# Altium schematic symbol library NXP_60_26022015.SCHLIB: 1306 symbols (part 15 of 28)
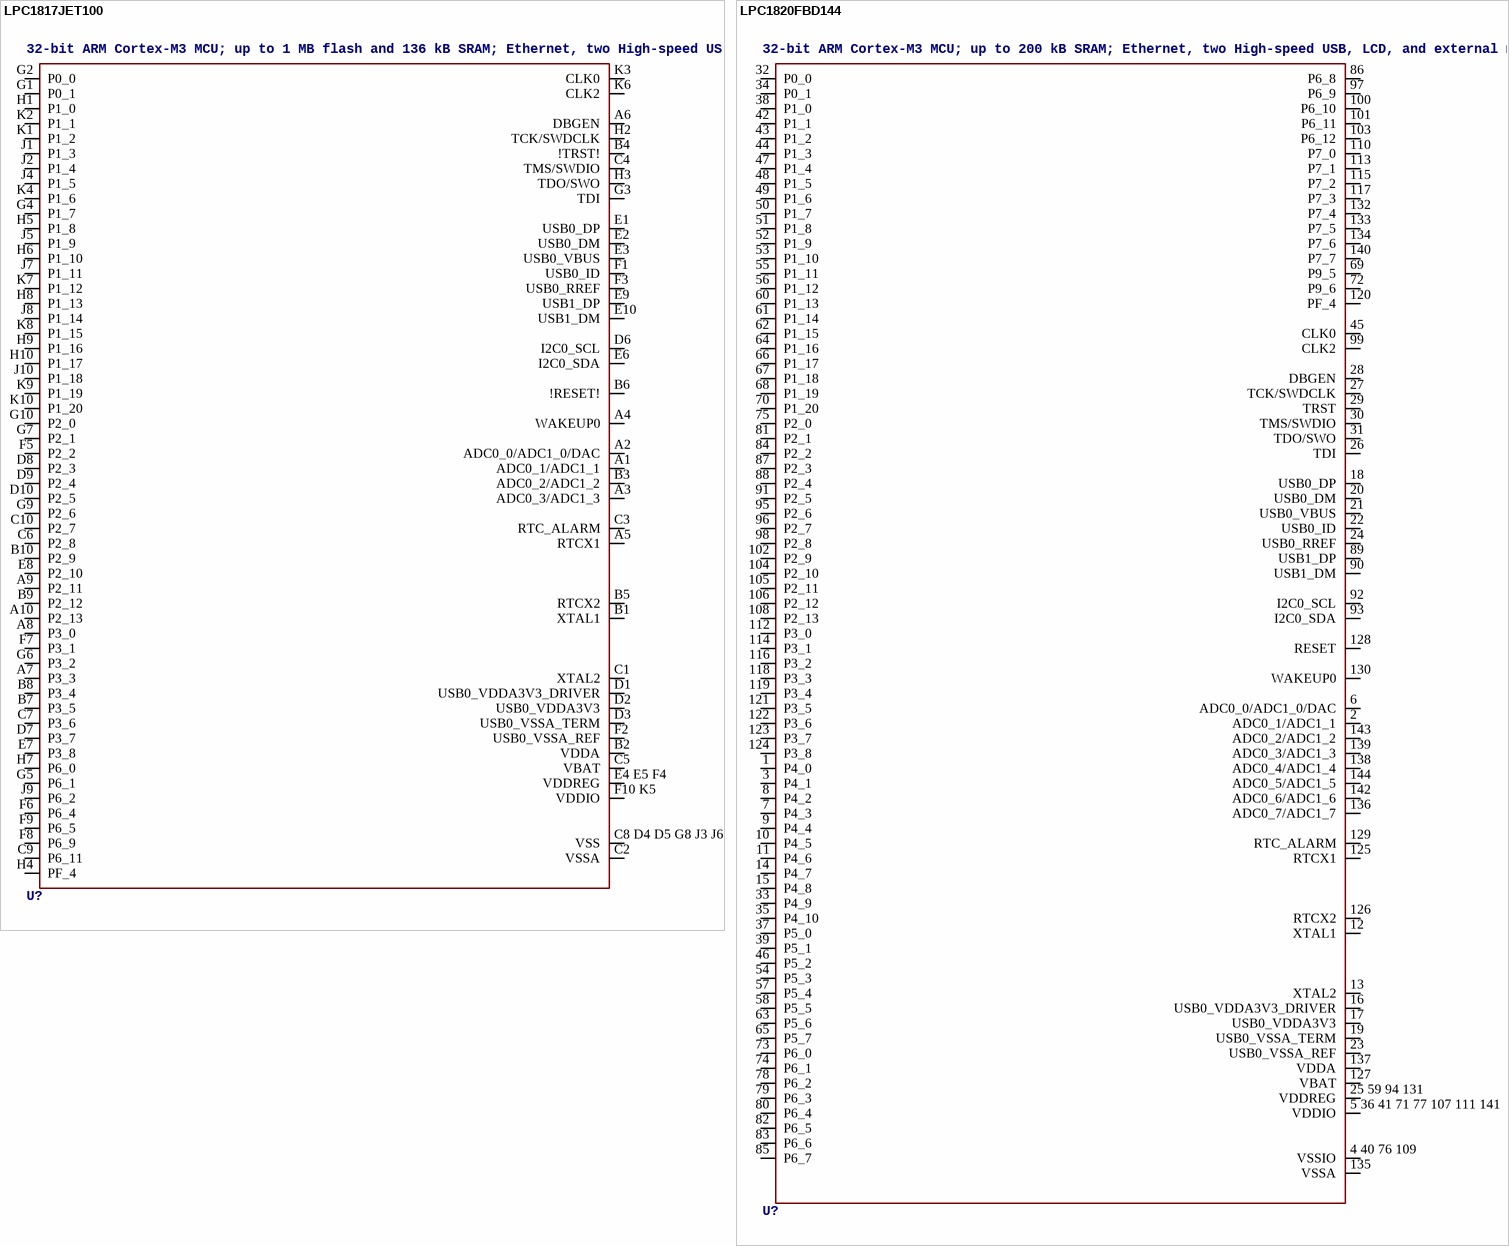
[diagram p199: symbols LPC1817JET100 to LPC1820FBD144]

## LPC1817JET100
designator U?, comment 32-bit ARM Cortex-M3 MCU; up to 1 MB flash and 136 kB SRAM; Ethernet, two High-speed USB, LCD, EMC The LPC185x/3x/2x/1x are ARM Cortex-M3 based microcontrollers for embedded applications. The ARM Cortex-M3 is a next generation core that offers system enhancements such as low power consumption, enhanced debug features, and a high level of support block integration. The LPC185x/3x/2x/1x operate at CPU frequencies of up to 180 MHz. The ARM Cortex-M3 CPU incorporates a 3-stage pipeline and uses a Harvard architecture with separate local instruction and data buses as well as a third bus for peripherals. The ARM Cortex-M3 CPU also includes an internal prefetch unit that supports speculative branching. The LPC185x/3x/2x/1x include up to 1 MB of flash and 136 kB of on-chip SRAM, 16 kB of EEPROM memory, a quad SPI Flash Interface (SPIFI), a State Configurable Timer (SCT) subsystem, two High-speed USB controllers, Ethernet, LCD, an external memory controller, and multiple digital and analog peripherals.    AAL Eindhoven MK
ADC: 4; ETHERNET: yes; FLASH: 1MB; GPIO: 49; LCD: no; SRAM: 136kB; TEMPERATURE_RANGE: -40 °C to +105 °C; PWM: no; QEI: no; USB0: No; USB1: No
footprint SOT926-1
pins: A1 ADC0_1/ADC1_1, A2 ADC0_0/ADC1_0/DAC, A3 ADC0_3/ADC1_3, A4 WAKEUP0, A5 RTCX1, A6 DBGEN, A7 P3_3, A8 P3_0, A9 P2_11, A10 P2_13, B1 XTAL1, B2 VDDA, B3 ADC0_2/ADC1_2, B4 !TRST!, B5 RTCX2, B6 !RESET!, B7 P3_5, B8 P3_4, B9 P2_12, B10 P2_9, C1 XTAL2, C2 VSSA, C3 RTC_ALARM, C4 TMS/SWDIO, C5 VBAT, C6 P2_8, C7 P3_6, C8 D4 D5 G8 J3 J6 VSS, C9 P6_11, C10 P2_7, D1 USB0_VDDA3V3_DRIVER, D2 USB0_VDDA3V3, D3 USB0_VSSA_TERM, D6 I2C0_SCL, D7 P3_7, D8 P2_3, D9 P2_4, D10 P2_5, E1 USB0_DP, E2 USB0_DM, E3 USB0_VBUS, E4 E5 F4 VDDREG, E6 I2C0_SDA, E7 P3_8, E8 P2_10, E9 USB1_DP, E10 USB1_DM, F1 USB0_ID, F2 USB0_VSSA_REF, F3 USB0_RREF, F5 P2_2, F6 P6_4, F7 P3_1, F8 P6_9, F9 P6_5, F10 K5 VDDIO, G1 P0_1, G2 P0_0, G3 TDI, G4 P1_7, G5 P6_1, G6 P3_2, G7 P2_1, G9 P2_6, G10 P2_0, H1 P1_0, H2 TCK/SWDCLK, H3 TDO/SWO, H4 PF_4, H5 P1_8, H6 P1_10, H7 P6_0, H8 P1_13, H9 P1_16, H10 P1_17, J1 P1_3, J2 P1_4, J4 P1_5, J5 P1_9, J7 P1_11, J8 P1_14, J9 P6_2, J10 P1_18, K1 P1_2, K2 P1_1, K3 CLK0, K4 P1_6, K6 CLK2, K7 P1_12, K8 P1_15, K9 P1_19, K10 P1_20

## LPC1820FBD144
designator U?, comment 32-bit ARM Cortex-M3 MCU; up to 200 kB SRAM; Ethernet, two High-speed USB, LCD, and external memory controller The LPC1850/30/20/10 are ARM Cortex-M3 based microcontrollers for embedded applications. The ARM Cortex-M3 is a next generation core that offers system enhancements such as low power consumption, enhanced debug features, and a high level of support block integration. The LPC1850/30/20/10 operate at CPU frequencies of up to 180 MHz. The ARM Cortex-M3 CPU incorporates a 3-stage pipeline and uses a Harvard architecture with separate local instruction and data buses as well as a third bus for peripherals. The ARM Cortex-M3 CPU also includes an internal prefetch unit that supports speculative branching. The LPC1850/30/20/10 include up to 200 kB of on-chip SRAM, a quad SPI Flash Interface (SPIFI), a State Configurable Timer (SCT) subsystem, two High-speed USB controllers, Ethernet, LCD, an external memory controller, and multiple digital and analog peripherals.    AAL Eindhoven MK
ADC: 8; ETHERNET: no; GPIO: 83; PWM: yes; SRAM: 168kB; USB0: Host/OTG; LCD: no; QEI: no; USB1: No
footprint SOT486-1
pins: 1 P4_0, 2 ADC0_1/ADC1_1, 3 P4_1, 4 40 76 109 VSSIO, 5 36 41 71 77 107 111 141 VDDIO, 6 ADC0_0/ADC1_0/DAC, 7 P4_3, 8 P4_2, 9 P4_4, 10 P4_5, 11 P4_6, 12 XTAL1, 13 XTAL2, 14 P4_7, 15 P4_8, 16 USB0_VDDA3V3_DRIVER, 17 USB0_VDDA3V3, 18 USB0_DP, 19 USB0_VSSA_TERM, 20 USB0_DM, 21 USB0_VBUS, 22 USB0_ID, 23 USB0_VSSA_REF, 24 USB0_RREF, 25 59 94 131 VDDREG, 26 TDI, 27 TCK/SWDCLK, 28 DBGEN, 29 TRST, 30 TMS/SWDIO, 31 TDO/SWO, 32 P0_0, 33 P4_9, 34 P0_1, 35 P4_10, 37 P5_0, 38 P1_0, 39 P5_1, 42 P1_1, 43 P1_2, 44 P1_3, 45 CLK0, 46 P5_2, 47 P1_4, 48 P1_5, 49 P1_6, 50 P1_7, 51 P1_8, 52 P1_9, 53 P1_10, 54 P5_3, 55 P1_11, 56 P1_12, 57 P5_4, 58 P5_5, 60 P1_13, 61 P1_14, 62 P1_15, 63 P5_6, 64 P1_16, 65 P5_7, 66 P1_17, 67 P1_18, 68 P1_19, 69 P9_5, 70 P1_20, 72 P9_6, 73 P6_0, 74 P6_1, 75 P2_0, 78 P6_2, 79 P6_3, 80 P6_4, 81 P2_1, 82 P6_5, 83 P6_6, 84 P2_2, 85 P6_7, 86 P6_8, 87 P2_3, 88 P2_4, 89 USB1_DP, 90 USB1_DM, 91 P2_5, 92 I2C0_SCL, 93 I2C0_SDA, 95 P2_6, 96 P2_7, 97 P6_9, 98 P2_8, 99 CLK2, 100 P6_10, 101 P6_11, 102 P2_9, 103 P6_12, 104 P2_10, 105 P2_11, 106 P2_12, 108 P2_13, 110 P7_0, 112 P3_0, 113 P7_1, 114 P3_1, 115 P7_2, 116 P3_2, 117 P7_3, 118 P3_3, 119 P3_4, 120 PF_4, 121 P3_5, 122 P3_6, 123 P3_7, 124 P3_8, 125 RTCX1, 126 RTCX2, 127 VBAT, 128 RESET, 129 RTC_ALARM, 130 WAKEUP0, 132 P7_4, 133 P7_5, 134 P7_6, 135 VSSA, 136 ADC0_7/ADC1_7, 137 VDDA, 138 ADC0_4/ADC1_4, 139 ADC0_3/ADC1_3, 140 P7_7, 142 ADC0_6/ADC1_6, 143 ADC0_2/ADC1_2, 144 ADC0_5/ADC1_5

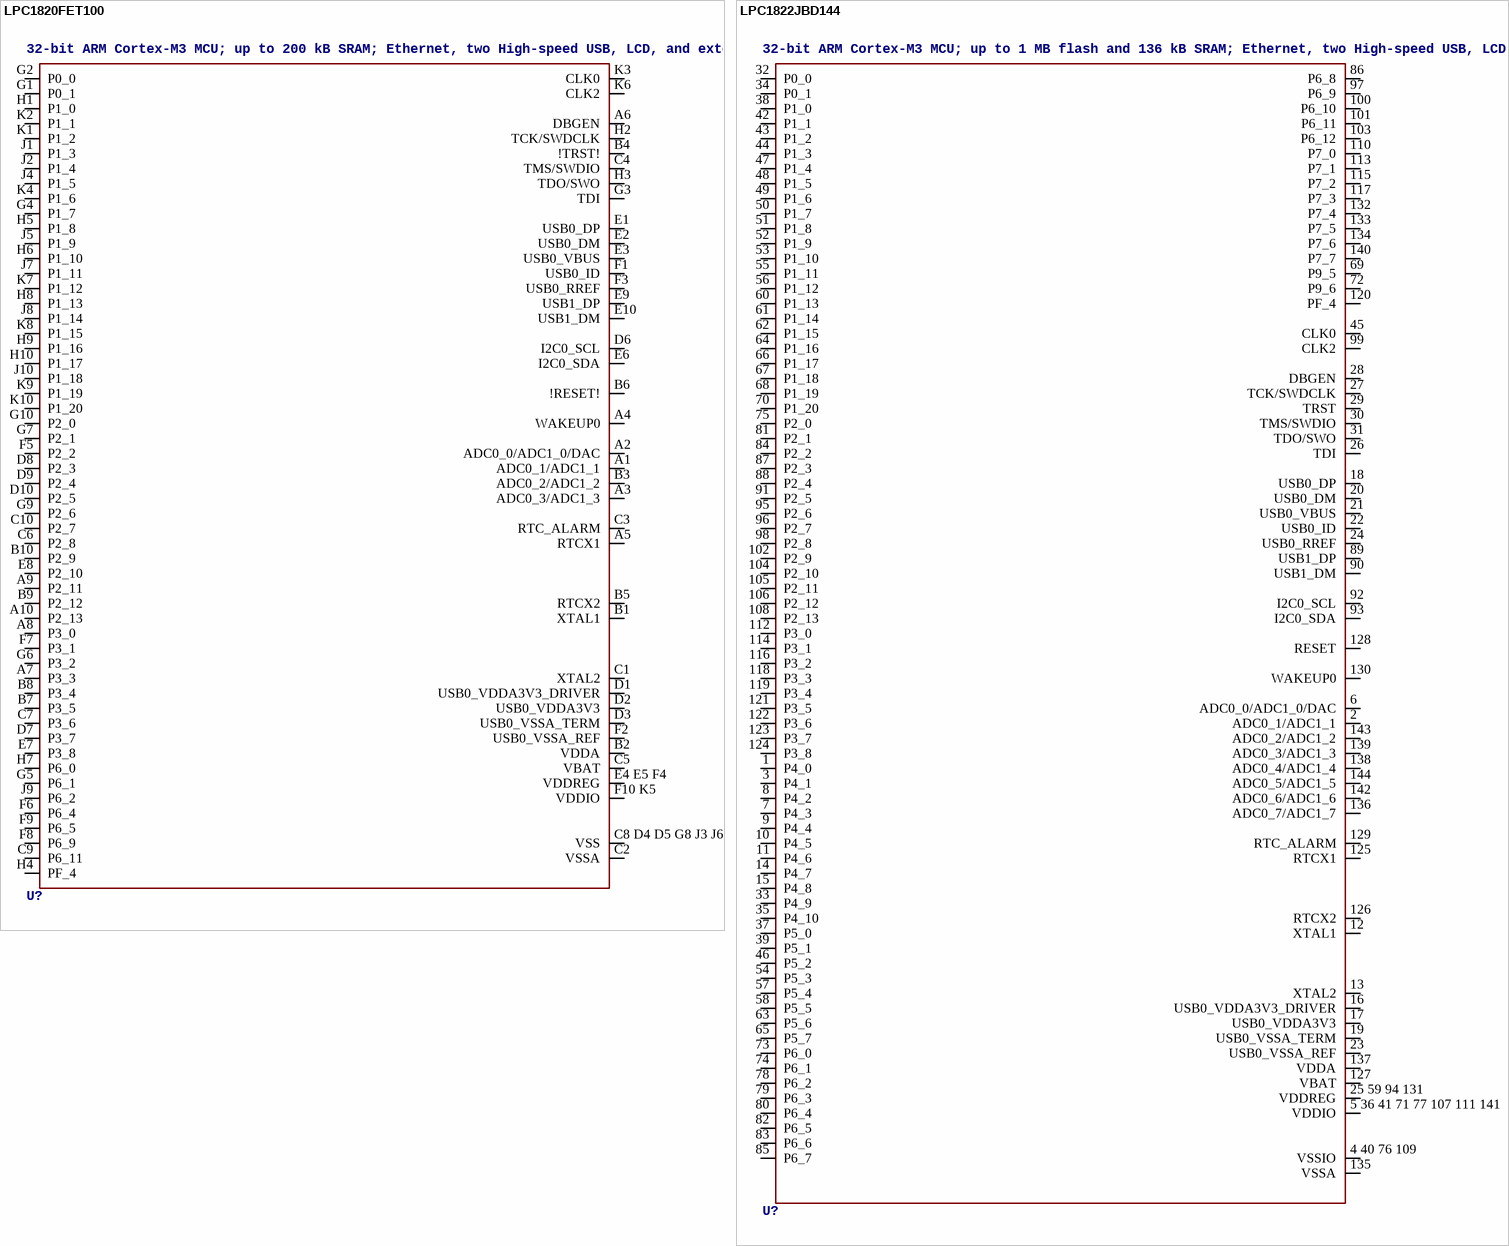
[diagram p91: symbols LPC1820FET100 to LPC1822JBD144]

## LPC1820FET100
designator U?, comment 32-bit ARM Cortex-M3 MCU; up to 200 kB SRAM; Ethernet, two High-speed USB, LCD, and external memory controller The LPC1850/30/20/10 are ARM Cortex-M3 based microcontrollers for embedded applications. The ARM Cortex-M3 is a next generation core that offers system enhancements such as low power consumption, enhanced debug features, and a high level of support block integration. The LPC1850/30/20/10 operate at CPU frequencies of up to 180 MHz. The ARM Cortex-M3 CPU incorporates a 3-stage pipeline and uses a Harvard architecture with separate local instruction and data buses as well as a third bus for peripherals. The ARM Cortex-M3 CPU also includes an internal prefetch unit that supports speculative branching. The LPC1850/30/20/10 include up to 200 kB of on-chip SRAM, a quad SPI Flash Interface (SPIFI), a State Configurable Timer (SCT) subsystem, two High-speed USB controllers, Ethernet, LCD, an external memory controller, and multiple digital and analog peripherals.    AAL Eindhoven MK
ADC: 4; ETHERNET: no; GPIO: 49; SRAM: 168kB; USB0: Host/OTG; LCD: no; PWM: no; QEI: no; USB1: No
footprint SOT926-1
pins: A1 ADC0_1/ADC1_1, A2 ADC0_0/ADC1_0/DAC, A3 ADC0_3/ADC1_3, A4 WAKEUP0, A5 RTCX1, A6 DBGEN, A7 P3_3, A8 P3_0, A9 P2_11, A10 P2_13, B1 XTAL1, B2 VDDA, B3 ADC0_2/ADC1_2, B4 !TRST!, B5 RTCX2, B6 !RESET!, B7 P3_5, B8 P3_4, B9 P2_12, B10 P2_9, C1 XTAL2, C2 VSSA, C3 RTC_ALARM, C4 TMS/SWDIO, C5 VBAT, C6 P2_8, C7 P3_6, C8 D4 D5 G8 J3 J6 VSS, C9 P6_11, C10 P2_7, D1 USB0_VDDA3V3_DRIVER, D2 USB0_VDDA3V3, D3 USB0_VSSA_TERM, D6 I2C0_SCL, D7 P3_7, D8 P2_3, D9 P2_4, D10 P2_5, E1 USB0_DP, E2 USB0_DM, E3 USB0_VBUS, E4 E5 F4 VDDREG, E6 I2C0_SDA, E7 P3_8, E8 P2_10, E9 USB1_DP, E10 USB1_DM, F1 USB0_ID, F2 USB0_VSSA_REF, F3 USB0_RREF, F5 P2_2, F6 P6_4, F7 P3_1, F8 P6_9, F9 P6_5, F10 K5 VDDIO, G1 P0_1, G2 P0_0, G3 TDI, G4 P1_7, G5 P6_1, G6 P3_2, G7 P2_1, G9 P2_6, G10 P2_0, H1 P1_0, H2 TCK/SWDCLK, H3 TDO/SWO, H4 PF_4, H5 P1_8, H6 P1_10, H7 P6_0, H8 P1_13, H9 P1_16, H10 P1_17, J1 P1_3, J2 P1_4, J4 P1_5, J5 P1_9, J7 P1_11, J8 P1_14, J9 P6_2, J10 P1_18, K1 P1_2, K2 P1_1, K3 CLK0, K4 P1_6, K6 CLK2, K7 P1_12, K8 P1_15, K9 P1_19, K10 P1_20

## LPC1822JBD144
designator U?, comment 32-bit ARM Cortex-M3 MCU; up to 1 MB flash and 136 kB SRAM; Ethernet, two High-speed USB, LCD, EMC The LPC185x/3x/2x/1x are ARM Cortex-M3 based microcontrollers for embedded applications. The ARM Cortex-M3 is a next generation core that offers system enhancements such as low power consumption, enhanced debug features, and a high level of support block integration. The LPC185x/3x/2x/1x operate at CPU frequencies of up to 180 MHz. The ARM Cortex-M3 CPU incorporates a 3-stage pipeline and uses a Harvard architecture with separate local instruction and data buses as well as a third bus for peripherals. The ARM Cortex-M3 CPU also includes an internal prefetch unit that supports speculative branching. The LPC185x/3x/2x/1x include up to 1 MB of flash and 136 kB of on-chip SRAM, 16 kB of EEPROM memory, a quad SPI Flash Interface (SPIFI), a State Configurable Timer (SCT) subsystem, two High-speed USB controllers, Ethernet, LCD, an external memory controller, and multiple digital and analog peripherals.    AAL Eindhoven MK
ADC: 8; ETHERNET: no; FLASH: 512kB (1 bank); GPIO: 83; PWM: yes; SRAM: 104kB; TEMPERATURE_RANGE: -40 °C to +105 °C; USB0: Host/OTG; LCD: no; QEI: no; USB1: No
footprint SOT486-1
pins: 1 P4_0, 2 ADC0_1/ADC1_1, 3 P4_1, 4 40 76 109 VSSIO, 5 36 41 71 77 107 111 141 VDDIO, 6 ADC0_0/ADC1_0/DAC, 7 P4_3, 8 P4_2, 9 P4_4, 10 P4_5, 11 P4_6, 12 XTAL1, 13 XTAL2, 14 P4_7, 15 P4_8, 16 USB0_VDDA3V3_DRIVER, 17 USB0_VDDA3V3, 18 USB0_DP, 19 USB0_VSSA_TERM, 20 USB0_DM, 21 USB0_VBUS, 22 USB0_ID, 23 USB0_VSSA_REF, 24 USB0_RREF, 25 59 94 131 VDDREG, 26 TDI, 27 TCK/SWDCLK, 28 DBGEN, 29 TRST, 30 TMS/SWDIO, 31 TDO/SWO, 32 P0_0, 33 P4_9, 34 P0_1, 35 P4_10, 37 P5_0, 38 P1_0, 39 P5_1, 42 P1_1, 43 P1_2, 44 P1_3, 45 CLK0, 46 P5_2, 47 P1_4, 48 P1_5, 49 P1_6, 50 P1_7, 51 P1_8, 52 P1_9, 53 P1_10, 54 P5_3, 55 P1_11, 56 P1_12, 57 P5_4, 58 P5_5, 60 P1_13, 61 P1_14, 62 P1_15, 63 P5_6, 64 P1_16, 65 P5_7, 66 P1_17, 67 P1_18, 68 P1_19, 69 P9_5, 70 P1_20, 72 P9_6, 73 P6_0, 74 P6_1, 75 P2_0, 78 P6_2, 79 P6_3, 80 P6_4, 81 P2_1, 82 P6_5, 83 P6_6, 84 P2_2, 85 P6_7, 86 P6_8, 87 P2_3, 88 P2_4, 89 USB1_DP, 90 USB1_DM, 91 P2_5, 92 I2C0_SCL, 93 I2C0_SDA, 95 P2_6, 96 P2_7, 97 P6_9, 98 P2_8, 99 CLK2, 100 P6_10, 101 P6_11, 102 P2_9, 103 P6_12, 104 P2_10, 105 P2_11, 106 P2_12, 108 P2_13, 110 P7_0, 112 P3_0, 113 P7_1, 114 P3_1, 115 P7_2, 116 P3_2, 117 P7_3, 118 P3_3, 119 P3_4, 120 PF_4, 121 P3_5, 122 P3_6, 123 P3_7, 124 P3_8, 125 RTCX1, 126 RTCX2, 127 VBAT, 128 RESET, 129 RTC_ALARM, 130 WAKEUP0, 132 P7_4, 133 P7_5, 134 P7_6, 135 VSSA, 136 ADC0_7/ADC1_7, 137 VDDA, 138 ADC0_4/ADC1_4, 139 ADC0_3/ADC1_3, 140 P7_7, 142 ADC0_6/ADC1_6, 143 ADC0_2/ADC1_2, 144 ADC0_5/ADC1_5

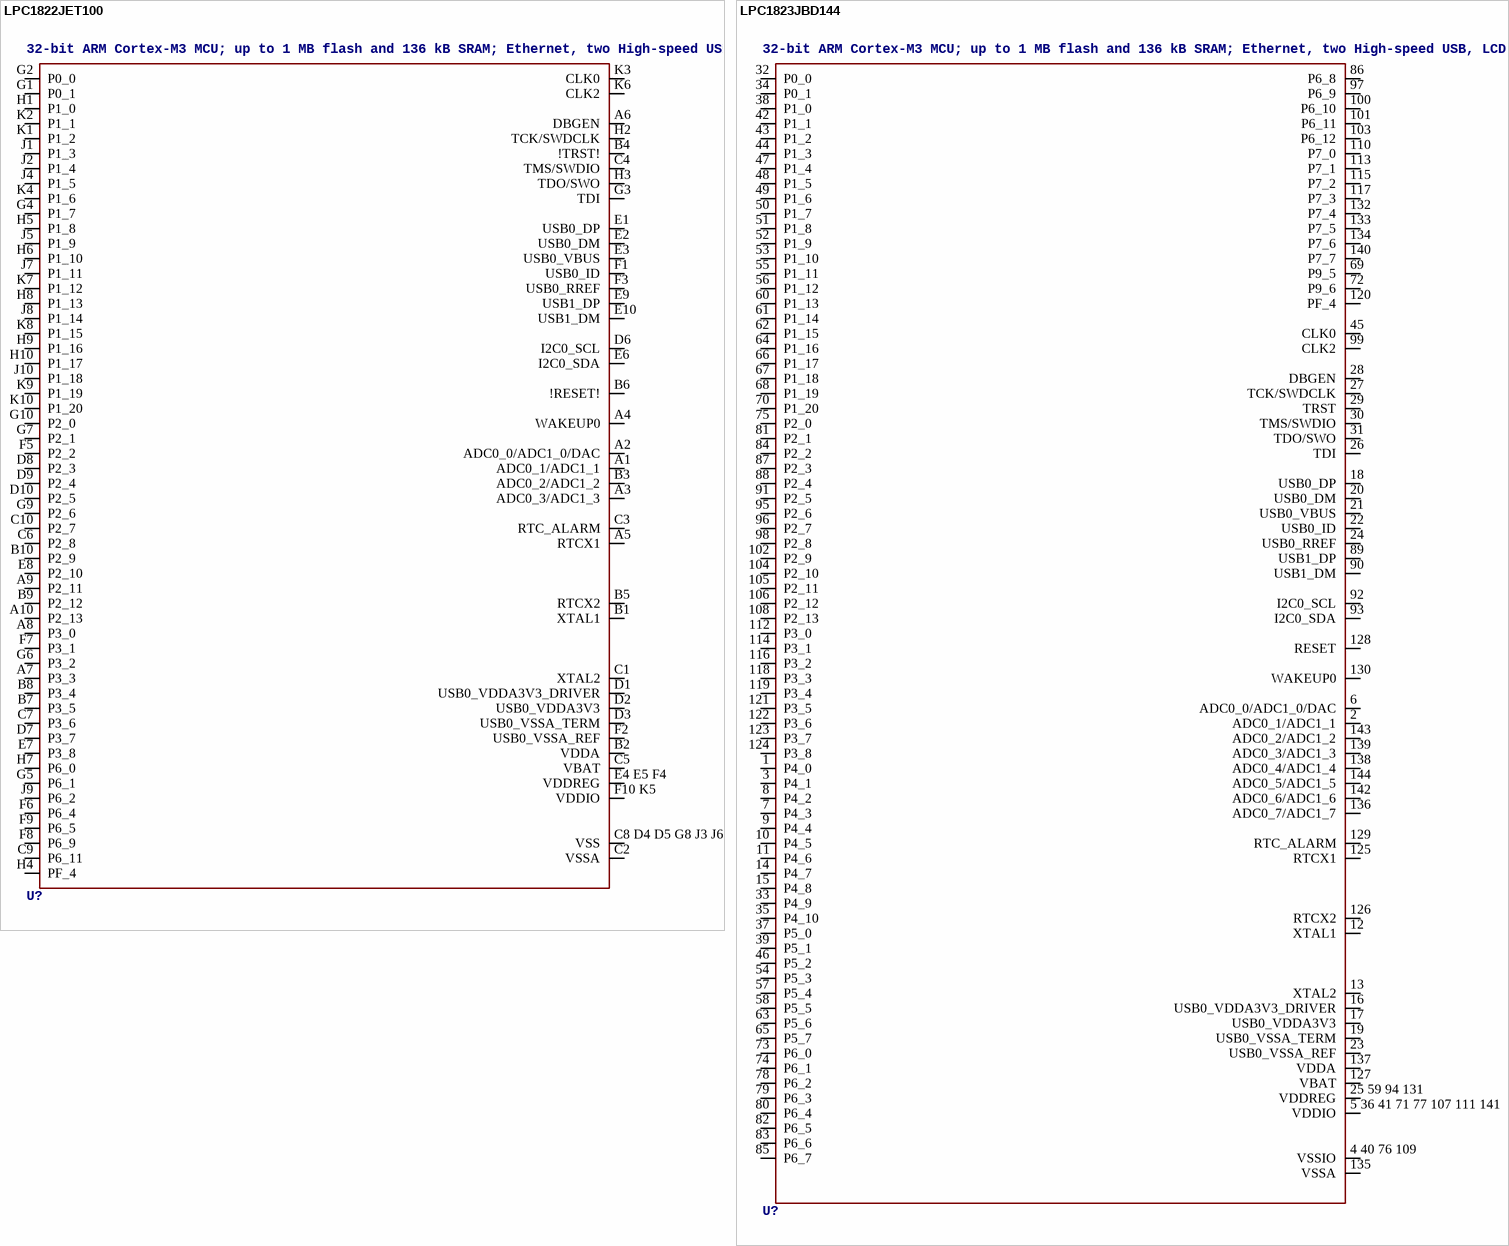
[diagram p92: symbols LPC1822JET100 to LPC1823JBD144]

## LPC1822JET100
designator U?, comment 32-bit ARM Cortex-M3 MCU; up to 1 MB flash and 136 kB SRAM; Ethernet, two High-speed USB, LCD, EMC The LPC185x/3x/2x/1x are ARM Cortex-M3 based microcontrollers for embedded applications. The ARM Cortex-M3 is a next generation core that offers system enhancements such as low power consumption, enhanced debug features, and a high level of support block integration. The LPC185x/3x/2x/1x operate at CPU frequencies of up to 180 MHz. The ARM Cortex-M3 CPU incorporates a 3-stage pipeline and uses a Harvard architecture with separate local instruction and data buses as well as a third bus for peripherals. The ARM Cortex-M3 CPU also includes an internal prefetch unit that supports speculative branching. The LPC185x/3x/2x/1x include up to 1 MB of flash and 136 kB of on-chip SRAM, 16 kB of EEPROM memory, a quad SPI Flash Interface (SPIFI), a State Configurable Timer (SCT) subsystem, two High-speed USB controllers, Ethernet, LCD, an external memory controller, and multiple digital and analog peripherals.    AAL Eindhoven MK
ADC: 4; ETHERNET: yes; FLASH: 512kB (1 bank); GPIO: 49; LCD: no; SRAM: 104kB; TEMPERATURE_RANGE: -40 °C to +105 °C; USB0: Host/OTG; PWM: no; QEI: no; USB1: No
footprint SOT926-1
pins: A1 ADC0_1/ADC1_1, A2 ADC0_0/ADC1_0/DAC, A3 ADC0_3/ADC1_3, A4 WAKEUP0, A5 RTCX1, A6 DBGEN, A7 P3_3, A8 P3_0, A9 P2_11, A10 P2_13, B1 XTAL1, B2 VDDA, B3 ADC0_2/ADC1_2, B4 !TRST!, B5 RTCX2, B6 !RESET!, B7 P3_5, B8 P3_4, B9 P2_12, B10 P2_9, C1 XTAL2, C2 VSSA, C3 RTC_ALARM, C4 TMS/SWDIO, C5 VBAT, C6 P2_8, C7 P3_6, C8 D4 D5 G8 J3 J6 VSS, C9 P6_11, C10 P2_7, D1 USB0_VDDA3V3_DRIVER, D2 USB0_VDDA3V3, D3 USB0_VSSA_TERM, D6 I2C0_SCL, D7 P3_7, D8 P2_3, D9 P2_4, D10 P2_5, E1 USB0_DP, E2 USB0_DM, E3 USB0_VBUS, E4 E5 F4 VDDREG, E6 I2C0_SDA, E7 P3_8, E8 P2_10, E9 USB1_DP, E10 USB1_DM, F1 USB0_ID, F2 USB0_VSSA_REF, F3 USB0_RREF, F5 P2_2, F6 P6_4, F7 P3_1, F8 P6_9, F9 P6_5, F10 K5 VDDIO, G1 P0_1, G2 P0_0, G3 TDI, G4 P1_7, G5 P6_1, G6 P3_2, G7 P2_1, G9 P2_6, G10 P2_0, H1 P1_0, H2 TCK/SWDCLK, H3 TDO/SWO, H4 PF_4, H5 P1_8, H6 P1_10, H7 P6_0, H8 P1_13, H9 P1_16, H10 P1_17, J1 P1_3, J2 P1_4, J4 P1_5, J5 P1_9, J7 P1_11, J8 P1_14, J9 P6_2, J10 P1_18, K1 P1_2, K2 P1_1, K3 CLK0, K4 P1_6, K6 CLK2, K7 P1_12, K8 P1_15, K9 P1_19, K10 P1_20

## LPC1823JBD144
designator U?, comment 32-bit ARM Cortex-M3 MCU; up to 1 MB flash and 136 kB SRAM; Ethernet, two High-speed USB, LCD, EMC The LPC185x/3x/2x/1x are ARM Cortex-M3 based microcontrollers for embedded applications. The ARM Cortex-M3 is a next generation core that offers system enhancements such as low power consumption, enhanced debug features, and a high level of support block integration. The LPC185x/3x/2x/1x operate at CPU frequencies of up to 180 MHz. The ARM Cortex-M3 CPU incorporates a 3-stage pipeline and uses a Harvard architecture with separate local instruction and data buses as well as a third bus for peripherals. The ARM Cortex-M3 CPU also includes an internal prefetch unit that supports speculative branching. The LPC185x/3x/2x/1x include up to 1 MB of flash and 136 kB of on-chip SRAM, 16 kB of EEPROM memory, a quad SPI Flash Interface (SPIFI), a State Configurable Timer (SCT) subsystem, two High-speed USB controllers, Ethernet, LCD, an external memory controller, and multiple digital and analog peripherals.    AAL Eindhoven MK
ADC: 8; ETHERNET: no; FLASH: 512kB; GPIO: 83; PWM: yes; SRAM: 104kB; TEMPERATURE_RANGE: -40 °C to +105 °C; USB0: Host/OTG; LCD: no; QEI: no; USB1: No
footprint SOT486-1
pins: 1 P4_0, 2 ADC0_1/ADC1_1, 3 P4_1, 4 40 76 109 VSSIO, 5 36 41 71 77 107 111 141 VDDIO, 6 ADC0_0/ADC1_0/DAC, 7 P4_3, 8 P4_2, 9 P4_4, 10 P4_5, 11 P4_6, 12 XTAL1, 13 XTAL2, 14 P4_7, 15 P4_8, 16 USB0_VDDA3V3_DRIVER, 17 USB0_VDDA3V3, 18 USB0_DP, 19 USB0_VSSA_TERM, 20 USB0_DM, 21 USB0_VBUS, 22 USB0_ID, 23 USB0_VSSA_REF, 24 USB0_RREF, 25 59 94 131 VDDREG, 26 TDI, 27 TCK/SWDCLK, 28 DBGEN, 29 TRST, 30 TMS/SWDIO, 31 TDO/SWO, 32 P0_0, 33 P4_9, 34 P0_1, 35 P4_10, 37 P5_0, 38 P1_0, 39 P5_1, 42 P1_1, 43 P1_2, 44 P1_3, 45 CLK0, 46 P5_2, 47 P1_4, 48 P1_5, 49 P1_6, 50 P1_7, 51 P1_8, 52 P1_9, 53 P1_10, 54 P5_3, 55 P1_11, 56 P1_12, 57 P5_4, 58 P5_5, 60 P1_13, 61 P1_14, 62 P1_15, 63 P5_6, 64 P1_16, 65 P5_7, 66 P1_17, 67 P1_18, 68 P1_19, 69 P9_5, 70 P1_20, 72 P9_6, 73 P6_0, 74 P6_1, 75 P2_0, 78 P6_2, 79 P6_3, 80 P6_4, 81 P2_1, 82 P6_5, 83 P6_6, 84 P2_2, 85 P6_7, 86 P6_8, 87 P2_3, 88 P2_4, 89 USB1_DP, 90 USB1_DM, 91 P2_5, 92 I2C0_SCL, 93 I2C0_SDA, 95 P2_6, 96 P2_7, 97 P6_9, 98 P2_8, 99 CLK2, 100 P6_10, 101 P6_11, 102 P2_9, 103 P6_12, 104 P2_10, 105 P2_11, 106 P2_12, 108 P2_13, 110 P7_0, 112 P3_0, 113 P7_1, 114 P3_1, 115 P7_2, 116 P3_2, 117 P7_3, 118 P3_3, 119 P3_4, 120 PF_4, 121 P3_5, 122 P3_6, 123 P3_7, 124 P3_8, 125 RTCX1, 126 RTCX2, 127 VBAT, 128 RESET, 129 RTC_ALARM, 130 WAKEUP0, 132 P7_4, 133 P7_5, 134 P7_6, 135 VSSA, 136 ADC0_7/ADC1_7, 137 VDDA, 138 ADC0_4/ADC1_4, 139 ADC0_3/ADC1_3, 140 P7_7, 142 ADC0_6/ADC1_6, 143 ADC0_2/ADC1_2, 144 ADC0_5/ADC1_5

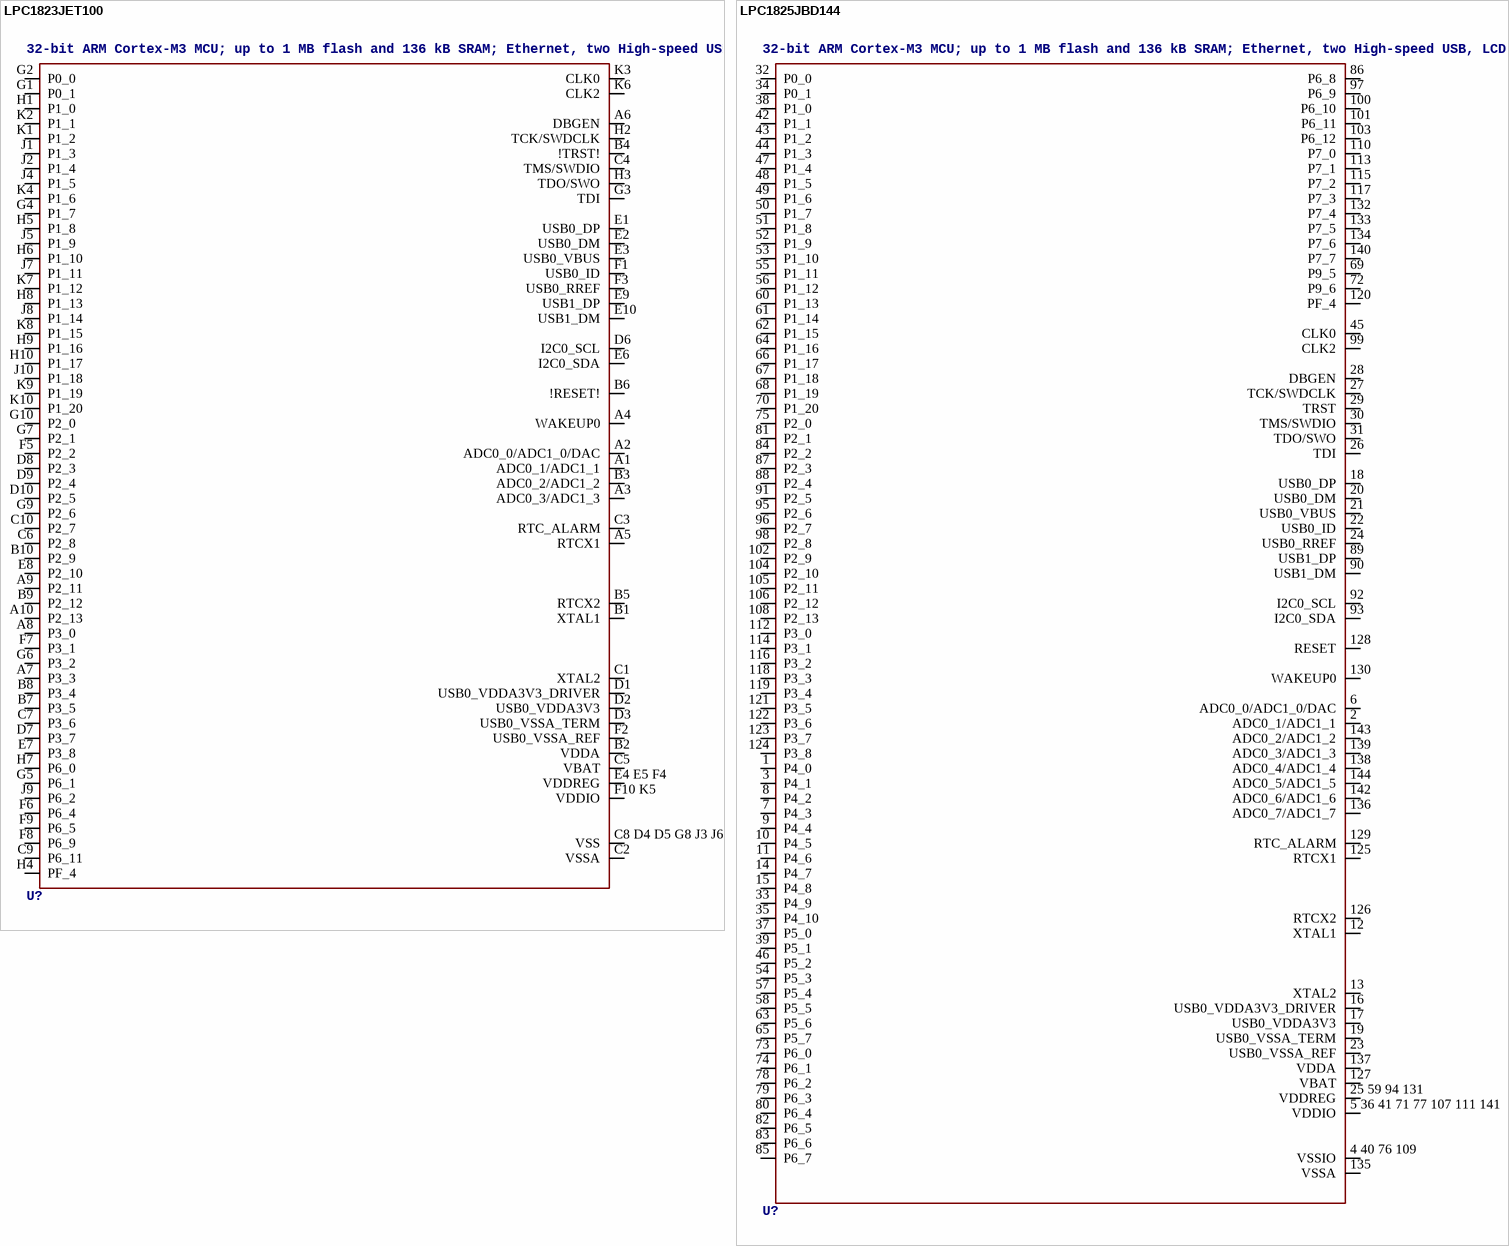
[diagram p93: symbols LPC1823JET100 to LPC1825JBD144]

## LPC1823JET100
designator U?, comment 32-bit ARM Cortex-M3 MCU; up to 1 MB flash and 136 kB SRAM; Ethernet, two High-speed USB, LCD, EMC The LPC185x/3x/2x/1x are ARM Cortex-M3 based microcontrollers for embedded applications. The ARM Cortex-M3 is a next generation core that offers system enhancements such as low power consumption, enhanced debug features, and a high level of support block integration. The LPC185x/3x/2x/1x operate at CPU frequencies of up to 180 MHz. The ARM Cortex-M3 CPU incorporates a 3-stage pipeline and uses a Harvard architecture with separate local instruction and data buses as well as a third bus for peripherals. The ARM Cortex-M3 CPU also includes an internal prefetch unit that supports speculative branching. The LPC185x/3x/2x/1x include up to 1 MB of flash and 136 kB of on-chip SRAM, 16 kB of EEPROM memory, a quad SPI Flash Interface (SPIFI), a State Configurable Timer (SCT) subsystem, two High-speed USB controllers, Ethernet, LCD, an external memory controller, and multiple digital and analog peripherals.    AAL Eindhoven MK
ADC: 4; ETHERNET: yes; FLASH: 512kB; GPIO: 49; LCD: no; SRAM: 104kB; TEMPERATURE_RANGE: -40 °C to +105 °C; USB0: Host/OTG; PWM: no; QEI: no; USB1: No
footprint SOT926-1
pins: A1 ADC0_1/ADC1_1, A2 ADC0_0/ADC1_0/DAC, A3 ADC0_3/ADC1_3, A4 WAKEUP0, A5 RTCX1, A6 DBGEN, A7 P3_3, A8 P3_0, A9 P2_11, A10 P2_13, B1 XTAL1, B2 VDDA, B3 ADC0_2/ADC1_2, B4 !TRST!, B5 RTCX2, B6 !RESET!, B7 P3_5, B8 P3_4, B9 P2_12, B10 P2_9, C1 XTAL2, C2 VSSA, C3 RTC_ALARM, C4 TMS/SWDIO, C5 VBAT, C6 P2_8, C7 P3_6, C8 D4 D5 G8 J3 J6 VSS, C9 P6_11, C10 P2_7, D1 USB0_VDDA3V3_DRIVER, D2 USB0_VDDA3V3, D3 USB0_VSSA_TERM, D6 I2C0_SCL, D7 P3_7, D8 P2_3, D9 P2_4, D10 P2_5, E1 USB0_DP, E2 USB0_DM, E3 USB0_VBUS, E4 E5 F4 VDDREG, E6 I2C0_SDA, E7 P3_8, E8 P2_10, E9 USB1_DP, E10 USB1_DM, F1 USB0_ID, F2 USB0_VSSA_REF, F3 USB0_RREF, F5 P2_2, F6 P6_4, F7 P3_1, F8 P6_9, F9 P6_5, F10 K5 VDDIO, G1 P0_1, G2 P0_0, G3 TDI, G4 P1_7, G5 P6_1, G6 P3_2, G7 P2_1, G9 P2_6, G10 P2_0, H1 P1_0, H2 TCK/SWDCLK, H3 TDO/SWO, H4 PF_4, H5 P1_8, H6 P1_10, H7 P6_0, H8 P1_13, H9 P1_16, H10 P1_17, J1 P1_3, J2 P1_4, J4 P1_5, J5 P1_9, J7 P1_11, J8 P1_14, J9 P6_2, J10 P1_18, K1 P1_2, K2 P1_1, K3 CLK0, K4 P1_6, K6 CLK2, K7 P1_12, K8 P1_15, K9 P1_19, K10 P1_20

## LPC1825JBD144
designator U?, comment 32-bit ARM Cortex-M3 MCU; up to 1 MB flash and 136 kB SRAM; Ethernet, two High-speed USB, LCD, EMC The LPC185x/3x/2x/1x are ARM Cortex-M3 based microcontrollers for embedded applications. The ARM Cortex-M3 is a next generation core that offers system enhancements such as low power consumption, enhanced debug features, and a high level of support block integration. The LPC185x/3x/2x/1x operate at CPU frequencies of up to 180 MHz. The ARM Cortex-M3 CPU incorporates a 3-stage pipeline and uses a Harvard architecture with separate local instruction and data buses as well as a third bus for peripherals. The ARM Cortex-M3 CPU also includes an internal prefetch unit that supports speculative branching. The LPC185x/3x/2x/1x include up to 1 MB of flash and 136 kB of on-chip SRAM, 16 kB of EEPROM memory, a quad SPI Flash Interface (SPIFI), a State Configurable Timer (SCT) subsystem, two High-speed USB controllers, Ethernet, LCD, an external memory controller, and multiple digital and analog peripherals.    AAL Eindhoven MK
ADC: 8; ETHERNET: no; FLASH: 768kB; GPIO: 83; PWM: yes; SRAM: 136kB; TEMPERATURE_RANGE: -40 °C to +105 °C; USB0: Host/OTG; LCD: no; QEI: no; USB1: No
footprint SOT486-1
pins: 1 P4_0, 2 ADC0_1/ADC1_1, 3 P4_1, 4 40 76 109 VSSIO, 5 36 41 71 77 107 111 141 VDDIO, 6 ADC0_0/ADC1_0/DAC, 7 P4_3, 8 P4_2, 9 P4_4, 10 P4_5, 11 P4_6, 12 XTAL1, 13 XTAL2, 14 P4_7, 15 P4_8, 16 USB0_VDDA3V3_DRIVER, 17 USB0_VDDA3V3, 18 USB0_DP, 19 USB0_VSSA_TERM, 20 USB0_DM, 21 USB0_VBUS, 22 USB0_ID, 23 USB0_VSSA_REF, 24 USB0_RREF, 25 59 94 131 VDDREG, 26 TDI, 27 TCK/SWDCLK, 28 DBGEN, 29 TRST, 30 TMS/SWDIO, 31 TDO/SWO, 32 P0_0, 33 P4_9, 34 P0_1, 35 P4_10, 37 P5_0, 38 P1_0, 39 P5_1, 42 P1_1, 43 P1_2, 44 P1_3, 45 CLK0, 46 P5_2, 47 P1_4, 48 P1_5, 49 P1_6, 50 P1_7, 51 P1_8, 52 P1_9, 53 P1_10, 54 P5_3, 55 P1_11, 56 P1_12, 57 P5_4, 58 P5_5, 60 P1_13, 61 P1_14, 62 P1_15, 63 P5_6, 64 P1_16, 65 P5_7, 66 P1_17, 67 P1_18, 68 P1_19, 69 P9_5, 70 P1_20, 72 P9_6, 73 P6_0, 74 P6_1, 75 P2_0, 78 P6_2, 79 P6_3, 80 P6_4, 81 P2_1, 82 P6_5, 83 P6_6, 84 P2_2, 85 P6_7, 86 P6_8, 87 P2_3, 88 P2_4, 89 USB1_DP, 90 USB1_DM, 91 P2_5, 92 I2C0_SCL, 93 I2C0_SDA, 95 P2_6, 96 P2_7, 97 P6_9, 98 P2_8, 99 CLK2, 100 P6_10, 101 P6_11, 102 P2_9, 103 P6_12, 104 P2_10, 105 P2_11, 106 P2_12, 108 P2_13, 110 P7_0, 112 P3_0, 113 P7_1, 114 P3_1, 115 P7_2, 116 P3_2, 117 P7_3, 118 P3_3, 119 P3_4, 120 PF_4, 121 P3_5, 122 P3_6, 123 P3_7, 124 P3_8, 125 RTCX1, 126 RTCX2, 127 VBAT, 128 RESET, 129 RTC_ALARM, 130 WAKEUP0, 132 P7_4, 133 P7_5, 134 P7_6, 135 VSSA, 136 ADC0_7/ADC1_7, 137 VDDA, 138 ADC0_4/ADC1_4, 139 ADC0_3/ADC1_3, 140 P7_7, 142 ADC0_6/ADC1_6, 143 ADC0_2/ADC1_2, 144 ADC0_5/ADC1_5

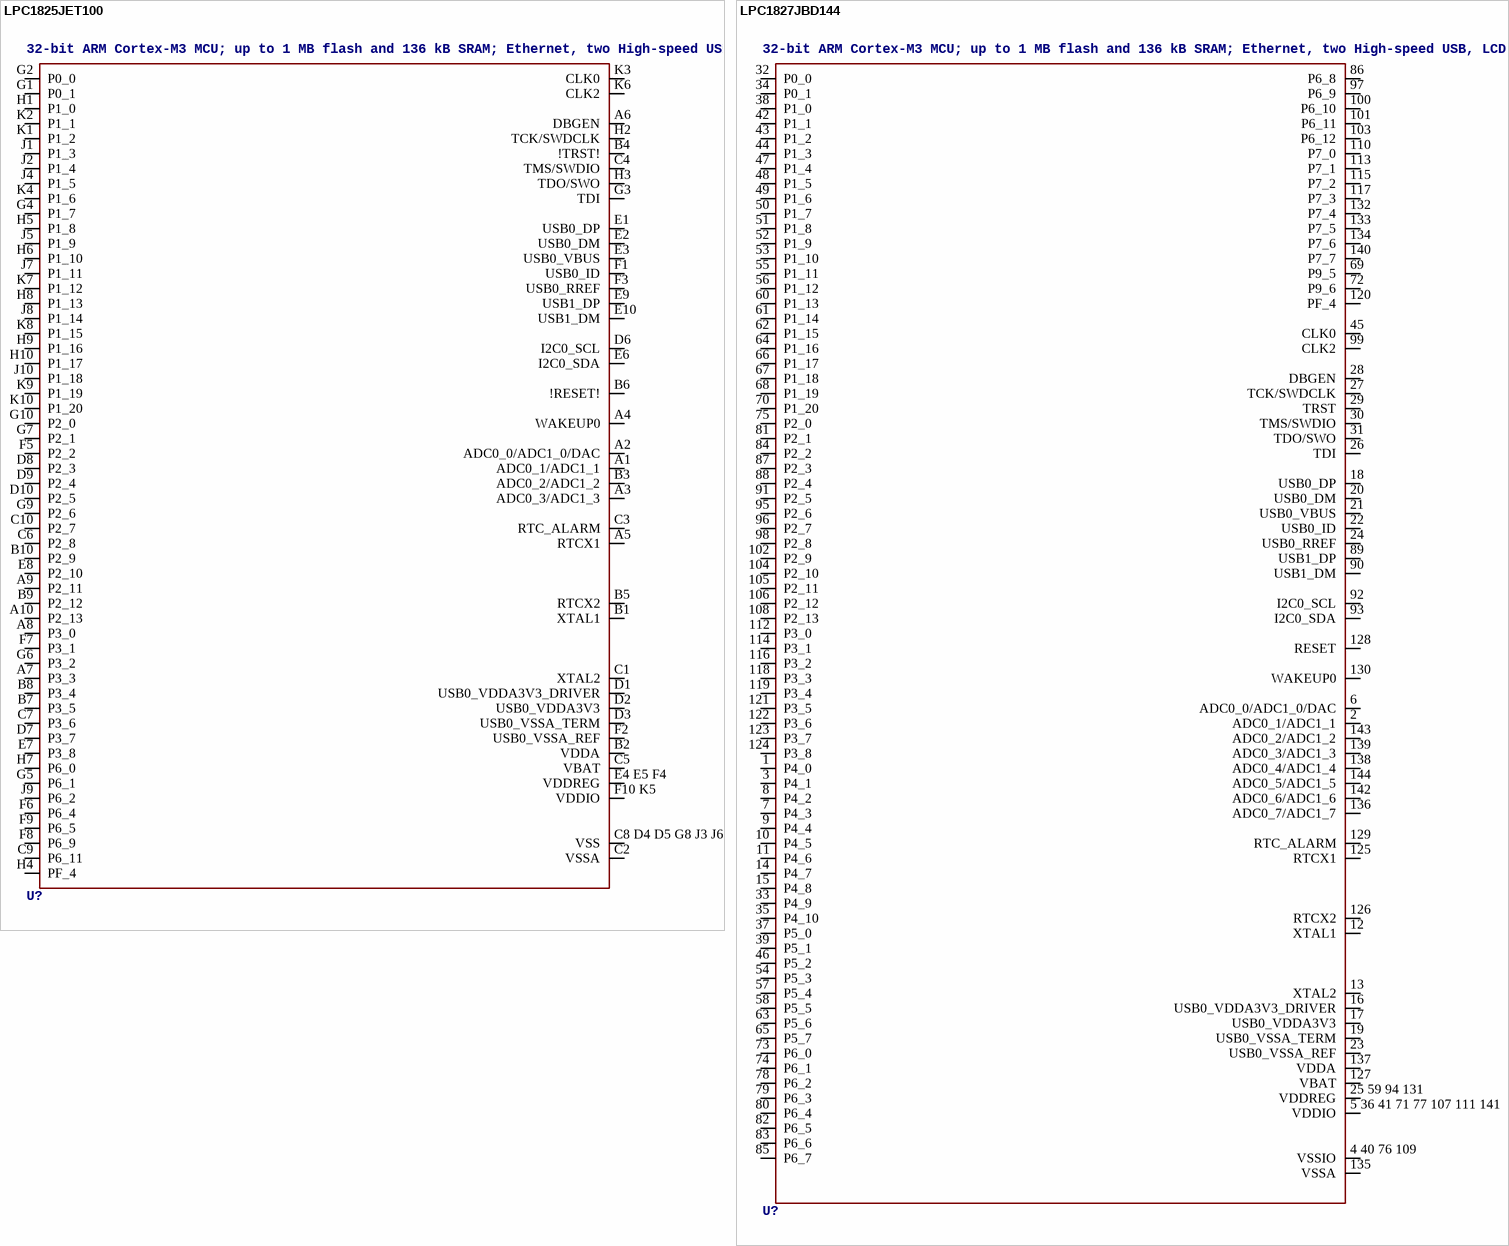
[diagram p94: symbols LPC1825JET100 to LPC1827JBD144]

## LPC1825JET100
designator U?, comment 32-bit ARM Cortex-M3 MCU; up to 1 MB flash and 136 kB SRAM; Ethernet, two High-speed USB, LCD, EMC The LPC185x/3x/2x/1x are ARM Cortex-M3 based microcontrollers for embedded applications. The ARM Cortex-M3 is a next generation core that offers system enhancements such as low power consumption, enhanced debug features, and a high level of support block integration. The LPC185x/3x/2x/1x operate at CPU frequencies of up to 180 MHz. The ARM Cortex-M3 CPU incorporates a 3-stage pipeline and uses a Harvard architecture with separate local instruction and data buses as well as a third bus for peripherals. The ARM Cortex-M3 CPU also includes an internal prefetch unit that supports speculative branching. The LPC185x/3x/2x/1x include up to 1 MB of flash and 136 kB of on-chip SRAM, 16 kB of EEPROM memory, a quad SPI Flash Interface (SPIFI), a State Configurable Timer (SCT) subsystem, two High-speed USB controllers, Ethernet, LCD, an external memory controller, and multiple digital and analog peripherals.    AAL Eindhoven MK
ADC: 4; ETHERNET: yes; FLASH: 768kB; GPIO: 49; LCD: no; SRAM: 136kB; TEMPERATURE_RANGE: -40 °C to +105 °C; USB0: Host/OTG; PWM: no; QEI: no; USB1: No
footprint SOT926-1
pins: A1 ADC0_1/ADC1_1, A2 ADC0_0/ADC1_0/DAC, A3 ADC0_3/ADC1_3, A4 WAKEUP0, A5 RTCX1, A6 DBGEN, A7 P3_3, A8 P3_0, A9 P2_11, A10 P2_13, B1 XTAL1, B2 VDDA, B3 ADC0_2/ADC1_2, B4 !TRST!, B5 RTCX2, B6 !RESET!, B7 P3_5, B8 P3_4, B9 P2_12, B10 P2_9, C1 XTAL2, C2 VSSA, C3 RTC_ALARM, C4 TMS/SWDIO, C5 VBAT, C6 P2_8, C7 P3_6, C8 D4 D5 G8 J3 J6 VSS, C9 P6_11, C10 P2_7, D1 USB0_VDDA3V3_DRIVER, D2 USB0_VDDA3V3, D3 USB0_VSSA_TERM, D6 I2C0_SCL, D7 P3_7, D8 P2_3, D9 P2_4, D10 P2_5, E1 USB0_DP, E2 USB0_DM, E3 USB0_VBUS, E4 E5 F4 VDDREG, E6 I2C0_SDA, E7 P3_8, E8 P2_10, E9 USB1_DP, E10 USB1_DM, F1 USB0_ID, F2 USB0_VSSA_REF, F3 USB0_RREF, F5 P2_2, F6 P6_4, F7 P3_1, F8 P6_9, F9 P6_5, F10 K5 VDDIO, G1 P0_1, G2 P0_0, G3 TDI, G4 P1_7, G5 P6_1, G6 P3_2, G7 P2_1, G9 P2_6, G10 P2_0, H1 P1_0, H2 TCK/SWDCLK, H3 TDO/SWO, H4 PF_4, H5 P1_8, H6 P1_10, H7 P6_0, H8 P1_13, H9 P1_16, H10 P1_17, J1 P1_3, J2 P1_4, J4 P1_5, J5 P1_9, J7 P1_11, J8 P1_14, J9 P6_2, J10 P1_18, K1 P1_2, K2 P1_1, K3 CLK0, K4 P1_6, K6 CLK2, K7 P1_12, K8 P1_15, K9 P1_19, K10 P1_20

## LPC1827JBD144
designator U?, comment 32-bit ARM Cortex-M3 MCU; up to 1 MB flash and 136 kB SRAM; Ethernet, two High-speed USB, LCD, EMC The LPC185x/3x/2x/1x are ARM Cortex-M3 based microcontrollers for embedded applications. The ARM Cortex-M3 is a next generation core that offers system enhancements such as low power consumption, enhanced debug features, and a high level of support block integration. The LPC185x/3x/2x/1x operate at CPU frequencies of up to 180 MHz. The ARM Cortex-M3 CPU incorporates a 3-stage pipeline and uses a Harvard architecture with separate local instruction and data buses as well as a third bus for peripherals. The ARM Cortex-M3 CPU also includes an internal prefetch unit that supports speculative branching. The LPC185x/3x/2x/1x include up to 1 MB of flash and 136 kB of on-chip SRAM, 16 kB of EEPROM memory, a quad SPI Flash Interface (SPIFI), a State Configurable Timer (SCT) subsystem, two High-speed USB controllers, Ethernet, LCD, an external memory controller, and multiple digital and analog peripherals.    AAL Eindhoven MK
ADC: 8; ETHERNET: no; FLASH: 1MB; GPIO: 83; PWM: yes; SRAM: 136kB; TEMPERATURE_RANGE: -40 °C to +105 °C; USB0: Host/OTG; LCD: no; QEI: no; USB1: No
footprint SOT486-1
pins: 1 P4_0, 2 ADC0_1/ADC1_1, 3 P4_1, 4 40 76 109 VSSIO, 5 36 41 71 77 107 111 141 VDDIO, 6 ADC0_0/ADC1_0/DAC, 7 P4_3, 8 P4_2, 9 P4_4, 10 P4_5, 11 P4_6, 12 XTAL1, 13 XTAL2, 14 P4_7, 15 P4_8, 16 USB0_VDDA3V3_DRIVER, 17 USB0_VDDA3V3, 18 USB0_DP, 19 USB0_VSSA_TERM, 20 USB0_DM, 21 USB0_VBUS, 22 USB0_ID, 23 USB0_VSSA_REF, 24 USB0_RREF, 25 59 94 131 VDDREG, 26 TDI, 27 TCK/SWDCLK, 28 DBGEN, 29 TRST, 30 TMS/SWDIO, 31 TDO/SWO, 32 P0_0, 33 P4_9, 34 P0_1, 35 P4_10, 37 P5_0, 38 P1_0, 39 P5_1, 42 P1_1, 43 P1_2, 44 P1_3, 45 CLK0, 46 P5_2, 47 P1_4, 48 P1_5, 49 P1_6, 50 P1_7, 51 P1_8, 52 P1_9, 53 P1_10, 54 P5_3, 55 P1_11, 56 P1_12, 57 P5_4, 58 P5_5, 60 P1_13, 61 P1_14, 62 P1_15, 63 P5_6, 64 P1_16, 65 P5_7, 66 P1_17, 67 P1_18, 68 P1_19, 69 P9_5, 70 P1_20, 72 P9_6, 73 P6_0, 74 P6_1, 75 P2_0, 78 P6_2, 79 P6_3, 80 P6_4, 81 P2_1, 82 P6_5, 83 P6_6, 84 P2_2, 85 P6_7, 86 P6_8, 87 P2_3, 88 P2_4, 89 USB1_DP, 90 USB1_DM, 91 P2_5, 92 I2C0_SCL, 93 I2C0_SDA, 95 P2_6, 96 P2_7, 97 P6_9, 98 P2_8, 99 CLK2, 100 P6_10, 101 P6_11, 102 P2_9, 103 P6_12, 104 P2_10, 105 P2_11, 106 P2_12, 108 P2_13, 110 P7_0, 112 P3_0, 113 P7_1, 114 P3_1, 115 P7_2, 116 P3_2, 117 P7_3, 118 P3_3, 119 P3_4, 120 PF_4, 121 P3_5, 122 P3_6, 123 P3_7, 124 P3_8, 125 RTCX1, 126 RTCX2, 127 VBAT, 128 RESET, 129 RTC_ALARM, 130 WAKEUP0, 132 P7_4, 133 P7_5, 134 P7_6, 135 VSSA, 136 ADC0_7/ADC1_7, 137 VDDA, 138 ADC0_4/ADC1_4, 139 ADC0_3/ADC1_3, 140 P7_7, 142 ADC0_6/ADC1_6, 143 ADC0_2/ADC1_2, 144 ADC0_5/ADC1_5
